# Altium footprint library avalon_all_V1.PcbLib: 81 footprints (part 3 of 6)
Each footprint in its own frame and in the unit in brackets; x right, y up, seen from the top. Pads: shape width x height; smd on the part's side, far side on the other; paste and mask are expansions set on the pad; w line width, h text height; cw(c..) or ccw(c..) is an arc to the next point about the centre after c.
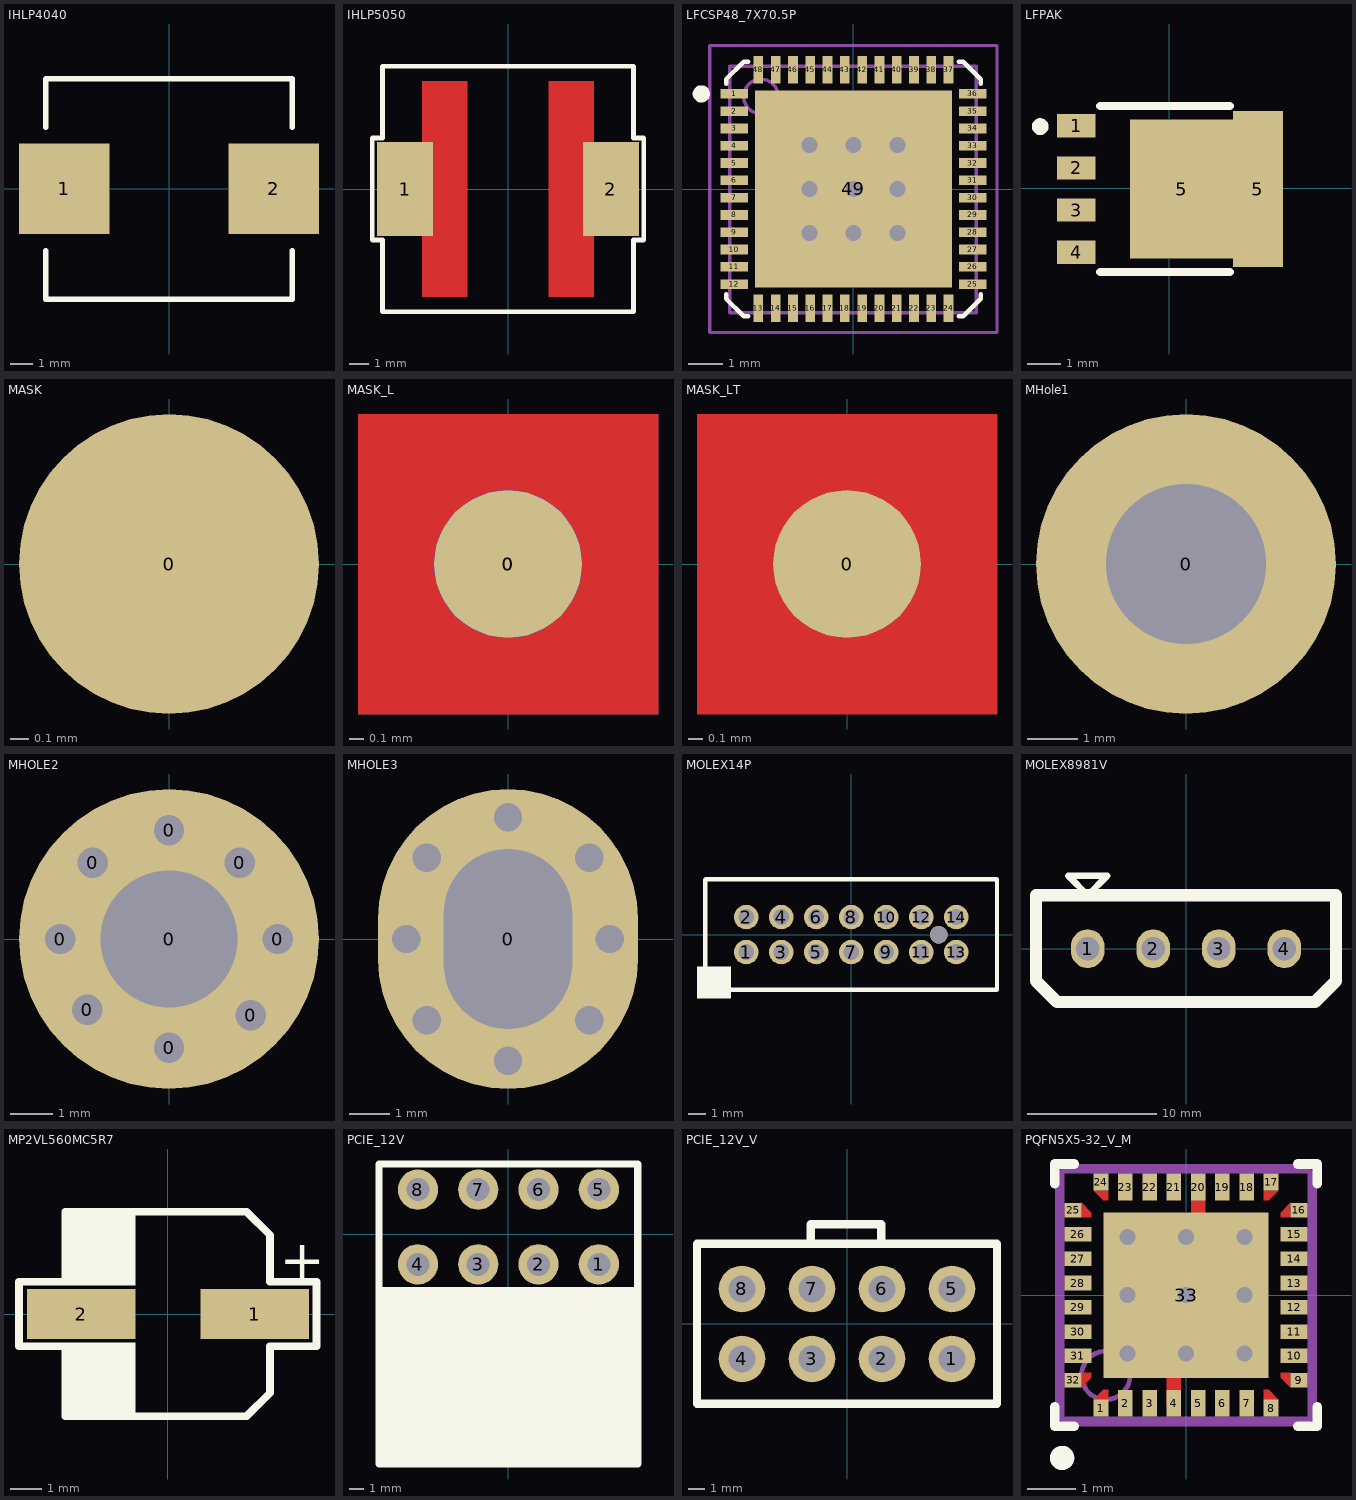
[diagram p2: the footprints below, top view; thin cyan lines are the x and y axes]

## IHLP4040 [mm]
pads (2):
  rect 4.1x4.1 smd: 1(-4.75,0) 2(4.75,0)
Top Overlay:
  lines w0.254: -5.587,-5.004 -5.587,-2.794 ; -5.587,2.794 -5.587,4.979 -5.566,5 5.575,5 ; -5.575,-5 5.575,-5 ; 5.587,-5.004 5.587,-2.794 ; 5.587,2.794 5.588,4.978

## IHLP5050 [mm]
pads (2):
  rect 2.945x4.95 smd: 1(-5.407,0) 2(5.407,0)
Top Layer:
  rectangle: 2.134,-5.664 4.521,5.664
  rectangle: -4.521,-5.664 -2.134,5.664
Top Overlay:
  lines w0.254: -7.137,-2.688 -6.6,-2.688 -6.6,-3.225 -6.6,-6.45 6.6,-6.45 6.6,-3.225 6.6,-2.688 7.137,-2.688 7.137,2.688 6.6,2.688 6.6,3.225 6.6,6.45 -6.6,6.45 -6.6,3.225 -6.6,2.688 -7.137,2.688 -7.137,-2.688
Top Paste:
  rectangle: 2.134,2.794 4.521,5.664
  rectangle: 2.134,-5.664 4.521,-2.794
  rectangle: -4.521,-5.664 -2.134,-2.794
  rectangle: -4.521,2.794 -2.134,5.664
  rectangle: -3.708,-2.413 -2.134,2.413
  rectangle: 2.134,-2.413 3.683,2.413
Top Solder:
  rectangle: 2.134,2.794 4.521,5.664
  rectangle: 2.134,-5.664 4.521,-2.794
  rectangle: 2.134,-2.54 3.683,2.54
  rectangle: -4.521,-5.664 -2.134,-2.794
  rectangle: -3.683,-2.54 -2.134,2.54
  rectangle: -4.521,2.794 -2.134,5.664
3D body: height 6.5, standoff 0, extent -6.6,-6.449 6.6,6.449

## LFCSP48_7X70.5P [mm] "QFN, 48-Leads, Body 7x7mm, Pitch 0.5mm, IPC Medium Density"
height 1
pads (49):
  rect 0.8x0.28 smd mask+0.075: 1(-3.45,2.75) 2(-3.45,2.25) 3(-3.45,1.75) 4(-3.45,1.25) 5(-3.45,0.75) 6(-3.45,0.25) 7(-3.45,-0.25) 8(-3.45,-0.75) 9(-3.45,-1.25) 10(-3.45,-1.75) 11(-3.45,-2.25) 12(-3.45,-2.75) 25(3.45,-2.75) 26(3.45,-2.25) 27(3.45,-1.75) 28(3.45,-1.25) 29(3.45,-0.75) 30(3.45,-0.25) 31(3.45,0.25) 32(3.45,0.75) 33(3.45,1.25) 34(3.45,1.75) 35(3.45,2.25) 36(3.45,2.75)
  rect 0.28x0.8 smd mask+0.075: 13(-2.75,-3.45) 14(-2.25,-3.45) 15(-1.75,-3.45) 16(-1.25,-3.45) 17(-0.75,-3.45) 18(-0.25,-3.45) 19(0.25,-3.45) 20(0.75,-3.45) 21(1.25,-3.45) 22(1.75,-3.45) 23(2.25,-3.45) 24(2.75,-3.45) 37(2.75,3.45) 38(2.25,3.45) 39(1.75,3.45) 40(1.25,3.45) 41(0.75,3.45) 42(0.25,3.45) 43(-0.25,3.45) 44(-0.75,3.45) 45(-1.25,3.45) 46(-1.75,3.45) 47(-2.25,3.45) 48(-2.75,3.45)
  rect 5.7x5.7 smd paste-0.762 mask-0.279: 49(0,0)
via 1.27,-1.27 diameter 0.813 hole 0.457
via 0,-1.27 diameter 0.813 hole 0.457
via -1.27,-1.27 diameter 0.813 hole 0.457
via -1.27,1.27 diameter 0.813 hole 0.457
via 0,1.27 diameter 0.813 hole 0.457
via 1.27,1.27 diameter 0.813 hole 0.457
via 1.27,0 diameter 0.813 hole 0.457
via -1.27,0 diameter 0.813 hole 0.457
via 0,0 diameter 0.813 hole 0.457
Top Overlay:
  circle w0.25: c-4.4,2.75 r0.125
  lines w0.127: -3.683,-3.048 -3.683,-3.175 -3.175,-3.683 -3.048,-3.683 ; -3.683,3.048 -3.683,3.175 -3.175,3.683 -3.048,3.683 ; 3.048,-3.683 3.175,-3.683 3.683,-3.175 3.683,-3.048 ; 3.048,3.683 3.175,3.683 3.683,3.175 3.683,3.048
Mechanical 13:
  circle w0.1: c-2.675,2.675 r0.5
  lines w0.1: -3.581,-3.575 -3.581,3.55 3.556,3.55 3.556,-3.575 -3.581,-3.575
Mechanical 15:
  lines w0.1: -0.5,0 0.5,0 ; 0,-0.5 0,0.5 ; -4.15,-4.15 -4.15,4.15 4.15,4.15 4.15,-4.15 -4.15,-4.15

## LFPAK [mm]
pads (6):
  rect 1.15x0.7 smd: 1(-2.801,1.88) 2(-2.801,0.61) 3(-2.801,-0.66) 4(-2.801,-1.93)
  rect 3.1x4.2 smd: 5(0.374,-0.025)
  rect 1.5x4.7 smd: 5(2.674,-0.025)
Top Overlay:
  circle w0.254: c-3.886,1.854 r0.127
  lines w0.254: -2.076,-2.525 1.824,-2.525 ; -2.076,2.475 1.824,2.475
3D body: height 0.3, standoff 0, extent -3.378,1.524 -2.032,2.235
3D body: height 0.3, standoff 0, extent -3.378,0.254 -2.032,0.965
3D body: height 0.3, standoff 0, extent -3.378,-1.016 -2.032,-0.305
3D body: height 0.3, standoff 0, extent -3.378,-2.286 -2.032,-1.575
3D body: height 0.3, standoff 0, extent 1.854,-2.311 3.429,2.261
3D body: height 0.8, standoff 0, extent -2.076,-2.525 1.824,2.475

## MASK [mm]
pads (1):
  round 1.6 smd: 0(0,0)
Top Solder:
  circle w1.6: c0,0 r0.8

## MASK_L [mm]
pads (2):
  round 1 smd: 0(0,0)
  round 1 smd far side: 0(0,0)
Top Layer:
  pour cut-out: -1.016,1.016 1.016,1.016 1.016,-1.016 -1.016,-1.016
Bottom Layer:
  pour cut-out: -1.016,1.016 1.016,1.016 1.016,-1.016 -1.016,-1.016
Top Paste:
  circle w1: c0,0 r0.5
Bottom Paste:
  circle w1: c0,0 r0.5
Top Solder:
  circle w1: c0,0 r0.5
Bottom Solder:
  circle w1: c0,0 r0.5

## MASK_LT [mm]
pads (1):
  round 1 smd: 0(0,0)
Top Layer:
  pour cut-out: -1.016,1.016 1.016,1.016 1.016,-1.016 -1.016,-1.016
Top Paste:
  circle w1: c0,0 r0.5
Top Solder:
  circle w1: c0,0 r0.5

## MHole1 [mm]
pads (1):
  round 6 hole 3.2: 0(0,0)

## MHOLE2 [mil]
pads (9):
  round 50 hole 28: 0(-100,0) 0(-75,-65) 0(-70,70) 0(0,-100) 0(0,100) 0(65,70) 0(75,-70) 0(100,0)
  round 275.59 hole 125.98 unplated: 0(0,0)
Keep-Out Layer:
  circle w10: c0,0 r60.42

## MHOLE3 [mm]
pads (1):
  oval 6.5x7.5 hole 3.2 slot 4.5 at 90 deg unplated: 0(0,0)
via 2.032,2.032 diameter 1.27 hole 0.711
via -2.032,2.032 diameter 1.27 hole 0.711
via -2.032,-2.032 diameter 1.27 hole 0.711
via 2.032,-2.032 diameter 1.27 hole 0.711
via 0,-3.048 diameter 1.27 hole 0.711
via 0,3.048 diameter 1.27 hole 0.711
via -2.54,0 diameter 1.27 hole 0.711
via 2.54,0 diameter 1.27 hole 0.711

## MOLEX14P [mm]
pads (14):
  round 1.4 hole 0.9: 1(-6,-1) 2(-6,1) 3(-4,-1) 4(-4,1) 5(-2,-1) 6(-2,1) 7(0,-1) 8(0,1) 9(2,-1) 10(2,1) 11(4,-1) 12(4,1) 13(6,-1) 14(6,1)
via 5,0 diameter 1 hole 1
Top Overlay:
  rectangle: -8.814,-3.658 -6.883,-1.829
  lines w0.254: -8.331,-3.124 -8.331,3.124 ; -8.325,-3.15 8.325,-3.15 ; -8.325,3.15 8.325,3.15 ; 8.331,-3.124 8.331,3.124

## MOLEX8981V [mm] "D-type connector"
height 10
pads (4):
  oval 2.6x3 hole 1.8: 1(-7.62,0) 2(-2.54,0) 3(2.54,0) 4(7.62,0)
Top Overlay:
  lines w0.254: -8.62,5.64 -8.62,5.64
  lines w0.508: -9.12,5.64 -8.62,5.64 -6.12,5.64 -7.62,4.14 -9.12,5.64
  lines w0.94: 11.608,4.14 -11.63,4.14 -11.63,-2.51 -10,-4.14 10,-4.14 11.63,-2.51 11.63,4.14

## MP2VL560MC5R7 [mm] "MP2VL560MC5R7"
height 5.7
pads (2):
  rect 3.5x1.6 smd: 1(2.8,0) 2(-2.8,0)
Top Overlay:
  rectangle: -3.3,0.914 -1.041,3.3
  region: -1.041,-3.3 -1.041,-0.914 -3.3,-0.914 -3.3,-3.3
  lines w0.254: -4.801,-1.041 -3.3,-1.041 -3.3,-3.3 2.54,-3.3 3.3,-2.54 3.3,-1.041 4.801,-1.041 4.801,1.041 3.3,1.041 3.3,2.54 2.54,3.3 -3.3,3.3 -3.3,1.041 -4.801,1.041 -4.801,-1.041
  text "+" at 3.607,1.143 h1.27
3D body: height 5.7, standoff 0, extent -4.801,-3.301 4.801,3.301

## PCIE_12V [mm]
pads (8):
  round 2.8 hole 1.6: 1(6.3,-2.1) 2(2.1,-2.1) 3(-2.1,-2.1) 4(-6.3,-2.1) 5(6.3,3.1) 6(2.1,3.1) 7(-2.1,3.1) 8(-6.3,3.1)
Top Overlay:
  rectangle: -9.051,-16 8.992,-3.937
  lines w0.508: -8.839,-3.937 8.949,-3.937 ; 8.992,-16 -9,-16 -9,4.886 9,4.886 9,-16
3D body: height 10, standoff 0, extent -9.254,-16.254 9.254,5.14

## PCIE_12V_V [mm]
pads (8):
  round 2.8 hole 1.6: 1(6.3,-2.1) 2(2.1,-2.1) 3(-2.1,-2.1) 4(-6.3,-2.1) 5(6.3,2.1) 6(2.1,2.1) 7(-2.1,2.1) 8(-6.3,2.1)
Top Overlay:
  lines w0.508: -2.184,4.928 -2.184,5.994 2.057,5.994 2.057,4.851 ; -9,-4.8 8.992,-4.8 9,-4.792 9,4.801 -9,4.8 -9,-4.8
3D body: height 13, standoff 0, extent -9.001,-4.801 9.001,4.801

## PQFN5X5-32_V_M [mm]
height 0.8
pads (33):
  rect 0.3x0.35 smd paste-0.15: 1(-1.75,-2.325) 8(1.75,-2.325) 17(1.75,2.325) 24(-1.75,2.325)
  rect 0.3x0.55 smd paste-0.15: 2(-1.25,-2.225) 3(-0.75,-2.225) 4(-0.25,-2.225) 5(0.25,-2.225) 6(0.75,-2.225) 7(1.25,-2.225) 18(1.25,2.225) 19(0.75,2.225) 20(0.25,2.225) 21(-0.25,2.225) 22(-0.75,2.225) 23(-1.25,2.225)
  rect 0.35x0.3 smd paste-0.15: 9(2.325,-1.75) 16(2.325,1.75) 25(-2.325,1.75) 32(-2.325,-1.75)
  rect 0.55x0.3 smd paste-0.15: 10(2.225,-1.25) 11(2.225,-0.75) 12(2.225,-0.25) 13(2.225,0.25) 14(2.225,0.75) 15(2.225,1.25) 26(-2.225,1.25) 27(-2.225,0.75) 28(-2.225,0.25) 29(-2.225,-0.25) 30(-2.225,-0.75) 31(-2.225,-1.25)
  rect 3.4x3.4 smd paste-1.65 mask-0.1: 33(0,0)
via -1.2,-1.2 diameter 0.66 hole 0.33
via -1.2,0 diameter 0.66 hole 0.33
via 0,-1.2 diameter 0.66 hole 0.33
via 0,0 diameter 0.66 hole 0.33
via 0,1.2 diameter 0.66 hole 0.33
via 1.2,-1.2 diameter 0.66 hole 0.33
via 1.2,0 diameter 0.66 hole 0.33
via 1.2,1.2 diameter 0.66 hole 0.33
via -1.2,1.2 diameter 0.66 hole 0.33
Top Layer:
  region: -2.15,-1.6 -1.95,-1.6 -1.95,-1.7 -2.15,-1.9
  region: -2.15,1.6 -1.95,1.6 -1.95,1.7 -2.15,1.9
  region: 2.15,1.6 1.95,1.6 1.95,1.7 2.15,1.9
  region: 2.15,-1.6 1.95,-1.6 1.95,-1.7 2.15,-1.9
  region: -1.6,-2.15 -1.6,-1.95 -1.7,-1.95 -1.9,-2.15
  region: -1.6,2.15 -1.6,1.95 -1.7,1.95 -1.9,2.15
  region: 1.6,2.15 1.6,1.95 1.7,1.95 1.9,2.15
  region: 1.6,-2.15 1.6,-1.95 1.7,-1.95 1.9,-2.15
  lines w0.3: -0.25,-2.225 -0.25,-1.375 ; 0.25,1.35 0.25,2.225
Top Overlay:
  circle w0.25: c-2.55,-3.35 r0.125
  lines w0.2: -2.7,-2.3 -2.7,-2.7 -2.3,-2.7 ; -2.7,2.3 -2.7,2.7 -2.3,2.7 ; 2.3,-2.7 2.7,-2.7 2.7,-2.3 ; 2.3,2.7 2.7,2.7 2.7,2.3
Top Paste:
  region: -1.102,-0.3 -1.102,0.3 -1.402,0.3 -1.402,-0.3
  region: -1.103,-1.3 -1.103,-0.7 -1.403,-0.7 -1.403,-1.3
  region: -1.103,0.7 -1.103,1.3 -1.403,1.3 -1.403,0.7
  region: -0.602,-0.3 -0.602,0.3 -0.902,0.3 -0.902,-0.3
  region: -0.603,0.7 -0.603,1.3 -0.903,1.3 -0.903,0.7
  region: -0.603,-1.3 -0.603,-0.7 -0.903,-0.7 -0.903,-1.3
  region: 0.898,-0.3 0.898,0.3 0.598,0.3 0.598,-0.3
  region: 0.897,-1.3 0.897,-0.7 0.597,-0.7 0.597,-1.3
  region: 0.897,0.7 0.897,1.3 0.597,1.3 0.597,0.7
  region: 1.398,-0.3 1.398,0.3 1.098,0.3 1.098,-0.3
  region: 1.397,0.7 1.397,1.3 1.097,1.3 1.097,0.7
  region: 1.397,-1.3 1.397,-0.7 1.097,-0.7 1.097,-1.3
  region: 0.402,-1.3 0.402,-0.7 0.102,-0.7 0.102,-1.3
  region: 0.402,0.7 0.402,1.3 0.102,1.3 0.102,0.7
  region: 0.402,-0.3 0.402,0.3 0.102,0.3 0.102,-0.3
  region: -0.098,0.7 -0.098,1.3 -0.398,1.3 -0.398,0.7
  region: -0.098,-1.3 -0.098,-0.7 -0.398,-0.7 -0.398,-1.3
  region: -0.098,-0.3 -0.098,0.3 -0.398,0.3 -0.398,-0.3
  region: -1.975,-1.1 -2.575,-1.1 -2.575,-1.4 -1.975,-1.4
  region: -1.975,-0.6 -2.575,-0.6 -2.575,-0.9 -1.975,-0.9
  region: -1.975,-0.1 -2.575,-0.1 -2.575,-0.4 -1.975,-0.4
  region: -1.975,0.4 -2.575,0.4 -2.575,0.1 -1.975,0.1
  region: -1.975,0.9 -2.575,0.9 -2.575,0.6 -1.975,0.6
  region: -1.975,1.4 -2.575,1.4 -2.575,1.1 -1.975,1.1
  region: -1.975,1.9 -2.575,1.9 -2.575,1.6 -1.975,1.6
  region: -1.975,-1.6 -2.575,-1.6 -2.575,-1.9 -1.975,-1.9
  rectangle: 1.975,-1.4 2.575,-1.1
  rectangle: 1.975,-0.9 2.575,-0.6
  rectangle: 1.975,-0.4 2.575,-0.1
  rectangle: 1.975,0.1 2.575,0.4
  rectangle: 1.975,0.6 2.575,0.9
  rectangle: 1.975,1.1 2.575,1.4
  rectangle: 1.975,1.6 2.575,1.9
  rectangle: 1.975,-1.9 2.575,-1.6
  region: -1.4,-1.975 -1.4,-2.575 -1.1,-2.575 -1.1,-1.975
  region: -0.9,-1.975 -0.9,-2.575 -0.6,-2.575 -0.6,-1.975
  region: -0.4,-1.975 -0.4,-2.575 -0.1,-2.575 -0.1,-1.975
  region: 0.1,-1.975 0.1,-2.575 0.4,-2.575 0.4,-1.975
  region: 0.6,-1.975 0.6,-2.575 0.9,-2.575 0.9,-1.975
  region: 1.1,-1.975 1.1,-2.575 1.4,-2.575 1.4,-1.975
  region: 1.6,-1.975 1.6,-2.575 1.9,-2.575 1.9,-1.975
  region: -1.9,-1.975 -1.9,-2.575 -1.6,-2.575 -1.6,-1.975
  region: -1.6,1.975 -1.6,2.575 -1.9,2.575 -1.9,1.975
  region: 1.9,1.975 1.9,2.575 1.6,2.575 1.6,1.975
  region: 1.4,1.975 1.4,2.575 1.1,2.575 1.1,1.975
  region: 0.9,1.975 0.9,2.575 0.6,2.575 0.6,1.975
  region: 0.4,1.975 0.4,2.575 0.1,2.575 0.1,1.975
  region: -0.1,1.975 -0.1,2.575 -0.4,2.575 -0.4,1.975
  region: -0.6,1.975 -0.6,2.575 -0.9,2.575 -0.9,1.975
  region: -1.1,1.975 -1.1,2.575 -1.4,2.575 -1.4,1.975
Mechanical 13:
  circle w0.1: c-1.65,-1.65 r0.5
  lines w0.1: -2.55,-2.55 2.55,-2.55 2.55,2.55 -2.55,2.55 -2.55,-2.55
Mechanical 15:
  lines w0.1: -0.5,0 0.5,0 ; 0,-0.5 0,0.5 ; -2.65,-2.65 2.65,-2.65 2.65,2.65 -2.65,2.65 -2.65,-2.65
3D body: height 1, standoff 0, extent -2.55,-2.55 2.55,2.55